# Altium footprint library PCB_Connector.PcbLib: 65 footprints (part 3 of 5)
Each footprint in its own frame and in the unit in brackets; x right, y up, seen from the top. Pads: shape width x height; smd on the part's side, far side on the other; paste and mask are expansions set on the pad; w line width, h text height; cw(c..) or ccw(c..) is an arc to the next point about the centre after c.
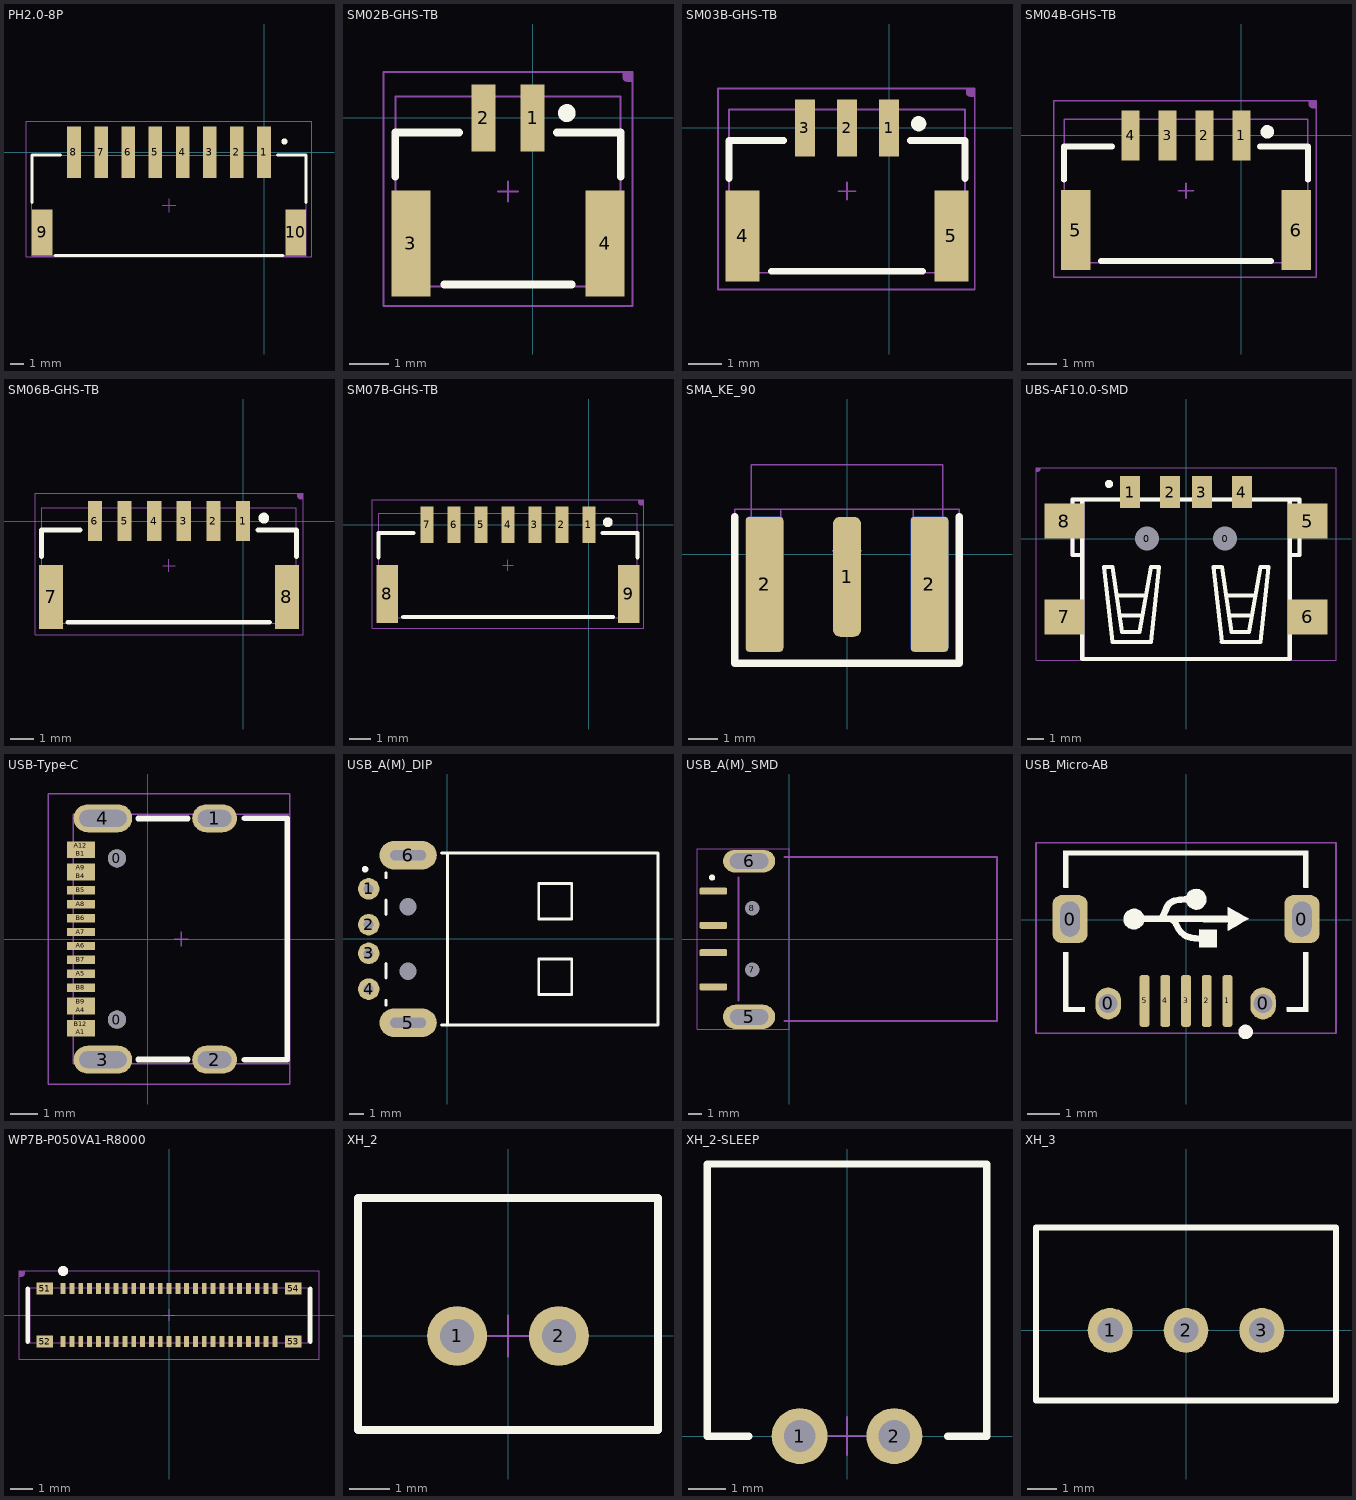
[diagram p2: the footprints below, top view; thin cyan lines are the x and y axes]

## PH2.0-8P [mm] "卧式PH2.0mm Pitch Header"
height 3.4
pads (10):
  rect 1x3.8 smd: 1(0,0) 2(-2,0) 3(-4,0) 4(-6,0) 5(-8,0) 6(-10,0) 7(-12,0) 8(-14,0)
  rect 1.5x3.4 smd: 9(-16.35,-5.9) 10(2.35,-5.9)
Top Overlay:
  circle w0.254: c1.5,0.8 r0.1
  lines w0.2: -17.1,-3.7 -17.1,-0.2 -15,-0.2 ; -15.4,-7.6 1.4,-7.6 ; 1,-0.2 3.1,-0.2 3.1,-3.7
Top Assembly (Mech13):
  lines w0.051: -7.5,-3.9 -6.5,-3.9 ; -7,-4.4 -7,-3.4 ; -17.1,-7.6 -17.1,-0.2 3.1,-0.2 3.1,-7.6 -17.1,-7.6
Top Component:
  lines w0.051: -17.5,-7.7 -17.5,2.3 3.5,2.3 3.5,1.5 3.5,-7.7 -17.5,-7.7
  text ".Designator" at -8.27,-4.408 h2.03
3D body "S8B-PH-SM4-TB.STEP": height 5.5, standoff -0.1, extent -16.95,-7.6 2.95,1

## SM02B-GHS-TB [mm] "GH02卧式"
height 4.25
pads (4):
  rect 0.6x1.7 smd: 1(0,0) 2(-1.25,0)
  rect 1x2.7 smd: 3(-3.1,-3.2) 4(1.85,-3.2)
Top Overlay:
  circle w0.254: c0.875,0.125 r0.1
  lines w0.2: -3.5,-1.5 -3.5,-0.375 -1.875,-0.375 ; -2.25,-4.25 1,-4.25 ; 0.625,-0.375 2.25,-0.375 2.25,-1.5
Top Assembly (Mech13):
  lines w0.051: -0.879,-1.875 -0.371,-1.875 ; -0.625,-2.129 -0.625,-1.621 ; -3.5,-4.3 2.25,-4.3 2.25,0.55 -3.5,0.55 -3.5,-4.3
Top Component:
  region: 2.55,1.173 2.55,0.919 2.423,0.919 2.398,0.919 2.351,0.938 2.315,0.974 2.296,1.021 2.296,1.046 2.296,1.173
  lines w0.051: -3.8,-4.796 -3.8,1.173 2.55,1.173 2.55,-4.796 -3.8,-4.796
  text ".Designator" at -1.895,-2.383 h2.03
3D body "SM02B-GHS-TB.STEP": height 4.35, standoff 0, extent -3.5,-4.3 2.25,0.55

## SM03B-GHS-TB [mm] "GH03卧式"
height 4.25
pads (5):
  rect 0.6x1.7 smd: 1(0,0) 2(-1.25,0) 3(-2.5,0)
  rect 1x2.7 smd: 4(-4.35,-3.2) 5(1.85,-3.2)
Top Overlay:
  circle w0.254: c0.875,0.125 r0.1
  lines w0.2: -4.75,-1.5 -4.75,-0.375 -3.125,-0.375 ; -3.5,-4.25 1,-4.25 ; 0.625,-0.375 2.25,-0.375 2.25,-1.5
Top Assembly (Mech13):
  lines w0.051: -1.504,-1.875 -0.996,-1.875 ; -1.25,-2.129 -1.25,-1.621 ; -4.75,-4.3 2.25,-4.3 2.25,0.55 -4.75,0.55 -4.75,-4.3
Top Component:
  region: 2.54,1.173 2.54,0.919 2.413,0.919 2.388,0.919 2.341,0.938 2.305,0.974 2.286,1.021 2.286,1.046 2.286,1.173
  lines w0.051: -5.08,-4.796 -5.08,1.173 2.54,1.173 2.54,-4.796 -5.08,-4.796
  text ".Designator" at -2.52,-2.383 h2.03
3D body "SM03B-GHS-TB.STEP": height 4.35, standoff 0, extent -4.75,-4.3 2.25,0.55

## SM04B-GHS-TB [mm] "GH04卧式"
height 4.25
pads (6):
  rect 0.6x1.7 smd: 1(0,0) 2(-1.25,0) 3(-2.5,0) 4(-3.75,0)
  rect 1x2.7 smd: 5(-5.6,-3.2) 6(1.85,-3.2)
Top Overlay:
  circle w0.254: c0.875,0.125 r0.1
  lines w0.2: -6,-1.5 -6,-0.375 -4.375,-0.375 ; -4.75,-4.25 1,-4.25 ; 0.625,-0.375 2.25,-0.375 2.25,-1.5
Top Assembly (Mech13):
  lines w0.051: -2.129,-1.875 -1.621,-1.875 ; -1.875,-2.129 -1.875,-1.621 ; -6,-4.3 2.25,-4.3 2.25,0.55 -6,0.55 -6,-4.3
Top Component:
  region: 2.54,1.173 2.54,0.919 2.413,0.919 2.388,0.919 2.341,0.938 2.305,0.974 2.286,1.021 2.286,1.046 2.286,1.173
  lines w0.051: -6.35,-4.796 -6.35,1.173 2.54,1.173 2.54,-4.796 -6.35,-4.796
  text ".Designator" at -3.145,-2.383 h2.03
3D body "SM04B-GHS-TB.STEP": height 4.35, standoff 0, extent -6,-4.3 2.25,0.55

## SM06B-GHS-TB [mm] "GH06卧式"
height 4.25
pads (8):
  rect 0.6x1.7 smd: 1(0,0) 2(-1.25,0) 3(-2.5,0) 4(-3.75,0) 5(-5,0) 6(-6.25,0)
  rect 1x2.7 smd: 7(-8.1,-3.2) 8(1.85,-3.2)
Top Overlay:
  circle w0.254: c0.875,0.125 r0.1
  lines w0.2: -8.5,-1.5 -8.5,-0.375 -6.875,-0.375 ; -7.391,-4.267 1.118,-4.267 ; 0.625,-0.375 2.25,-0.375 2.25,-1.5
Top Assembly (Mech13):
  lines w0.051: -3.379,-1.875 -2.871,-1.875 ; -3.125,-2.129 -3.125,-1.621 ; -8.5,-4.3 2.25,-4.3 2.25,0.55 -8.5,0.55 -8.5,-4.3
Top Component:
  region: 2.54,1.173 2.54,0.919 2.413,0.919 2.388,0.919 2.341,0.938 2.305,0.974 2.286,1.021 2.286,1.046 2.286,1.173
  lines w0.051: -8.763,-4.796 -8.763,1.173 2.54,1.173 2.54,-4.796 -8.763,-4.796
  text ".Designator" at -4.395,-2.383 h2.03
3D body "SM06B-GHS-TB.STEP": height 4.35, standoff 0, extent -8.5,-4.3 2.25,0.55

## SM07B-GHS-TB [mm] "GH07卧式"
height 4.25
pads (9):
  rect 0.6x1.7 smd: 1(0,0) 2(-1.25,0) 3(-2.5,0) 4(-3.75,0) 5(-5,0) 6(-6.25,0) 7(-7.5,0)
  rect 1x2.7 smd: 8(-9.35,-3.2) 9(1.85,-3.2)
Top Overlay:
  circle w0.254: c0.875,0.125 r0.1
  lines w0.2: -9.75,-1.5 -9.75,-0.375 -8.125,-0.375 ; -8.611,-4.267 1.118,-4.267 ; 0.625,-0.375 2.25,-0.375 2.25,-1.5
Top Assembly (Mech13):
  lines w0.051: -4.004,-1.875 -3.496,-1.875 ; -3.75,-2.129 -3.75,-1.621 ; -9.75,-4.3 2.25,-4.3 2.25,0.55 -9.75,0.55 -9.75,-4.3
Top Component:
  region: 2.54,1.173 2.54,0.919 2.413,0.919 2.388,0.919 2.341,0.938 2.305,0.974 2.286,1.021 2.286,1.046 2.286,1.173
  lines w0.051: -10.033,-4.796 -10.033,1.173 2.54,1.173 2.54,-4.796 -10.033,-4.796
  text ".Designator" at -5.02,-2.383 h2.03
3D body "SM07B-GHS-TB.STEP": height 4.35, standoff 0, extent -9.75,-4.3 2.25,0.55

## SMA_KE_90 [mil]
pads (5):
  rrect50% 37.4x160 smd paste-160: 1(0,-30)
  rrect20% 50x180 smd paste-180: 2(-110,-40) 2(110,-40)
  rrect20% 50x180 smd far side paste-180: 2(-110,-40) 2(110,-40)
Top Overlay:
  lines w10: -150,50 -150,-145 150,-145 150,50
Top Assembly (Mech13):
  lines w2: -88.58,60 -88.58,-97.48 -127.95,-97.48 -127.95,60 ; -19.69,5 19.68,5 ; 88.58,60 88.58,-97.48 127.95,-97.48 127.95,60 ; -127.95,60 127.95,60 ; -127.95,60 -127.95,119.06 127.95,119.06 127.95,60
Top Component:
  lines w2: -150,-145 -150,60 150,60 150,-145 -150,-145
  text ".Designator" at -55,-60 h80
3D body "ALSRobot-SMA-KHD19A.STEP": height 125.98, standoff -114.17, extent -120.08,-100 120.08,431.49

## UBS-AF10.0-SMD [mm] "USB-AF10.0/四脚贴片 无边"
pads (10):
  round 0.8 hole 1.5 unplated: 0(-2.45,0) 0(2.45,0)
  rect 1.25x2 smd: 1(-3.5,2.921) 2(-1,2.921) 3(1,2.921) 4(3.5,2.921)
  rect 2.5x2.2 smd: 5(7.625,1.1) 6(7.625,-4.9) 7(-7.625,-4.9) 8(-7.625,1.1)
Top Overlay:
  circle w0.254: c-4.826,3.429 r0.127
  lines w0.254: -6.5,-1.016 -7.112,-1.016 -7.112,2.45 -6.5,2.45 ; -4.363,-3.556 -2.585,-3.556 ; -4.109,-4.826 -2.839,-4.826 ; 2.495,-3.556 4.273,-3.556 ; 2.749,-4.826 4.019,-4.826 ; 6.5,-1.016 7.112,-1.016 7.112,2.45 6.5,2.45 ; -6.5,2.45 -6.5,-7.55 6.5,-7.55 6.5,2.45 ; -6.5,2.45 6.5,2.45 ; -5.125,-1.778 -4.617,-1.778 -4.019,-5.842 -2.921,-5.842 -2.204,-1.778 -1.696,-1.778 -2.204,-6.477 -4.617,-6.477 -5.125,-1.778 ; 1.733,-1.778 2.241,-6.477 4.654,-6.477 5.162,-1.778 4.654,-1.778 3.937,-5.842 2.839,-5.842 2.241,-1.778 1.733,-1.778
Top Assembly (Mech13):
  lines w0.254: -6.5,-1.016 -7.112,-1.016 -7.112,2.45 -6.5,2.45 ; 6.5,-1.016 7.112,-1.016 7.112,2.45 6.5,2.45 ; -6.5,2.45 -6.5,-7.55 6.5,-7.55 6.5,2.45 ; -6.5,2.45 6.5,2.45
Top Component:
  region: -9.398,4.445 -9.144,4.445 -9.144,4.318 -9.144,4.293 -9.163,4.246 -9.199,4.21 -9.246,4.191 -9.271,4.191 -9.398,4.191
  lines w0.051: -9.398,-7.62 9.398,-7.62 9.398,4.445 -9.398,4.445 -9.398,-7.62
3D body "USB-AF10.0-SMD.STEP": height 6.27, standoff -0.15, extent -8.25,-7.484 8.25,3.625

## USB-Type-C [mm]
pads (22):
  round 0.65 hole 0.65: 0(-1.105,-2.89) 0(-1.105,2.89)
  oval 1.6x1 hole 0.6 slot 1.2 at 0 deg: 1(2.395,4.325) 2(2.395,-4.325)
  oval 2.1x1 hole 0.6 slot 1.7 at 0 deg: 3(-1.605,-4.325) 4(-1.605,4.325)
  rect 1x0.3 smd: A1(-2.395,-3.35) A4(-2.395,-2.55) A5(-2.395,-1.25) A6(-2.395,-0.25) A7(-2.395,0.25) A8(-2.395,1.25) A9(-2.395,2.55) A12(-2.395,3.35) B1(-2.395,3.05) B4(-2.395,2.25) B5(-2.395,1.75) B6(-2.395,0.75) B7(-2.395,-0.75) B8(-2.395,-1.75) B9(-2.395,-2.25) B12(-2.395,-3.05)
Top Overlay:
  lines w0.203: -0.343,-4.318 1.435,-4.318 ; -0.343,4.318 1.435,4.318 ; 3.467,-4.325 4.995,-4.325 4.995,4.325 3.467,4.325
Top Assembly (Mech13):
  lines w0.051: 0.951,0 1.459,0 ; 1.205,-0.254 1.205,0.254 ; -2.67,-4.475 -2.67,4.475 5.08,4.475 5.08,-4.475 -2.67,-4.475
Top Component:
  lines w0.051: -3.556,-5.207 5.08,-5.207 5.08,5.207 -3.556,5.207 -3.556,-5.207
  text ".Designator" at -1.143,-0.508 h2.54
3D body "USB_TypeC.STEP": height 3.26, standoff -1, extent -2.67,-4.475 5.08,4.475

## USB_A(M)_DIP [mm]
pads (8):
  round 1.499 hole 0.7: 1(-5.5,3.5) 2(-5.5,1) 3(-5.5,-1) 4(-5.5,-3.5)
  oval 4x2 hole 0.7 slot 2.5 at 0 deg: 5(-2.75,-5.85) 6(-2.75,5.85)
  round 0.2 hole 1.2: 7(-2.75,-2.25) 8(-2.75,2.25)
Top Overlay:
  circle w0.254: c-5.754,4.872 r0.1
  lines w0.2: -4.3,-4.625 -4.3,-4.275 ; -4.3,-2.725 -4.3,-1.7 ; -4.3,1.7 -4.3,2.725 ; -4.3,4.275 -4.3,4.625 ; -0.425,-6 14.7,-6 14.7,6 -0.425,6 ; 0,-6 0,6 ; 6.375,-3.875 8.675,-3.875 8.675,-1.4 6.375,-1.4 6.375,-3.875 ; 6.375,1.4 6.375,3.875 8.675,3.875 8.675,1.4 6.375,1.4
Top Component:
  text ".Designator" at -4.318,-0.635 h2.54
3D body "SW3dPS-USB-Male Port.STEP": height 1.78, standoff -2.98, extent -3.529,-5.844 14.803,6.164

## USB_A(M)_SMD [mil]
height 177.17
pads (8):
  rrect50% 80x20 smd: 1(-218,137.8) 2(-218,39.37) 3(-218,-39.37) 4(-218,-137.8)
  oval 150x70 hole 45 slot 110 at 0 deg: 5(-115,-224)
  oval 150x65 hole 45 slot 111 at 0 deg: 6(-115,224)
  round 32 hole 42: 7(-106.3,-88.58) 8(-106.3,88.58)
Top Overlay:
  circle w10: c-221.54,176.81 r3.94
Top Assembly (Mech13):
  lines w6: -145.67,-176.18 -145.67,176.18 ; -12.99,-236.22 598.43,-236.22 598.43,236.22 -12.99,236.22
Top Component:
  lines w2: -265,-260 0,-260 0,260 -265,260 -265,-260
  text ".Designator" at -220,-25 h100
3D body "SW3dPS-USB-Male Port.STEP": height 70, standoff -117.5, extent -145.67,-236.37 576.08,236.37

## USB_Micro-AB [mil]
height 153.54
pads (9):
  rrect50% 43.31x59.06 hole 23.62 slot 43.31 at 90 deg: 0(-143,1) 0(143,1)
  oval 31.5x39.37 hole 23.62: 0(-96,-103) 0(95,-103)
  rrect50% 12x64 smd: 1(51.18,-100) 2(25.59,-100) 3(0,-100) 4(-25.59,-100) 5(-51.18,-100)
Top Overlay:
  drawing of 25 lines, arcs and shapes, not listed
Top Component:
  lines w2: -185,-140 185,-140 185,95 -185,95 -185,-140
  text ".Designator" at -51.18,-30 h100
3D body "User Library-MicroUSB-B_Molex_105017-0001.STEP": height 108.07, standoff -21.85, extent -161.42,-109.33 161.42,104.45

## WP7B-P050VA1-R8000 [mm]
height 0.7
pads (54):
  rect 0.22x0.5 smd: 1(-4.8,1.2) 2(-4.8,-1.2) 3(-4.4,1.2) 4(-4.4,-1.2) 5(-4,1.2) 6(-4,-1.2) 7(-3.6,1.2) 8(-3.6,-1.2) 9(-3.2,1.2) 10(-3.2,-1.2) 11(-2.8,1.2) 12(-2.8,-1.2) 13(-2.4,1.2) 14(-2.4,-1.2) 15(-2,1.2) 16(-2,-1.2) 17(-1.6,1.2) 18(-1.6,-1.2) 19(-1.2,1.2) 20(-1.2,-1.2) 21(-0.8,1.2) 22(-0.8,-1.2) 23(-0.4,1.2) 24(-0.4,-1.2) 25(0,1.2) 26(0,-1.2) 27(0.4,1.2) 28(0.4,-1.2) 29(0.8,1.2) 30(0.8,-1.2) 31(1.2,1.2) 32(1.2,-1.2) 33(1.6,1.2) 34(1.6,-1.2) 35(2,1.2) 36(2,-1.2) 37(2.4,1.2) 38(2.4,-1.2) 39(2.8,1.2) 40(2.8,-1.2) 41(3.2,1.2) 42(3.2,-1.2) 43(3.6,1.2) 44(3.6,-1.2) 45(4,1.2) 46(4,-1.2) 47(4.4,1.2) 48(4.4,-1.2) 49(4.8,1.2) 50(4.8,-1.2)
  rect 0.75x0.55 smd: 51(-5.625,1.2) 52(-5.625,-1.2) 53(5.625,-1.2) 54(5.625,1.2)
Top Overlay:
  circle w0.254: c-4.8,2 r0.1
  lines w0.2: -6.4,-1.2 -6.4,1.2 ; 6.4,-1.2 6.4,1.2
Top Assembly (Mech13):
  lines w0.051: -0.254,0 0.254,0 ; 0,-0.254 0,0.254 ; -6.3,-1.25 -6.3,1.25 6.3,1.25 6.3,-1.25 -6.3,-1.25
Top Component:
  region: -6.8,2 -6.546,2 -6.546,1.873 -6.546,1.848 -6.565,1.801 -6.601,1.765 -6.648,1.746 -6.673,1.746 -6.8,1.746
  lines w0.051: -6.8,-2 -6.8,2 6.8,2 6.8,-2 -6.8,-2
  text ".Designator" at -0.8,-0.4 h2.03

## XH_2 [mm]
pads (2):
  round 1.5 hole 0.85: 1(-1.27,0) 2(1.27,0)
Top Overlay:
  lines w0.2: -3.75,-2.35 -3.75,3.45 3.75,3.45 3.75,-2.35 -3.75,-2.35
Top Assembly (Mech13):
  lines w0.051: -0.508,0 0.508,0 ; 0,-0.508 0,0.508
3D body "XH_2.STEP": height 7.21, standoff -3.19, extent -3.75,-2.35 3.75,3.45

## XH_2-SLEEP [mm]
pads (2):
  round 1.5 hole 0.85: 1(-1.27,0) 2(1.27,0)
Top Overlay:
  lines w0.2: -3.75,0 -3.75,7.3 3.75,7.3 3.75,0 ; -3.7,0 -2.63,0 ; 2.7,0 3.7,0
Top Assembly (Mech13):
  lines w0.051: -0.508,0 0.508,0 ; 0,-0.508 0,0.508
3D body "JST-XH-2.5mm-2P.STEP": height 5.95, standoff -3.35, extent -3.75,-0.34 3.75,7.3

## XH_3 [mm]
pads (3):
  round 1.5 hole 0.85: 1(-2.54,0) 2(0,0) 3(2.54,0)
Top Overlay:
  lines w0.2: -5.02,-2.35 -5.02,3.45 5.02,3.45 5.02,-2.35 -5.02,-2.35
3D body "XH_3.STEP": height 7.21, standoff -3.19, extent -5.02,-2.35 5.02,3.45